# Altium footprint library IntegratedPcbLib.PcbLib: 81 footprints (part 6 of 6)
Each footprint in its own frame and in the unit in brackets; x right, y up, seen from the top. Pads: shape width x height; smd on the part's side, far side on the other; paste and mask are expansions set on the pad; w line width, h text height; cw(c..) or ccw(c..) is an arc to the next point about the centre after c.
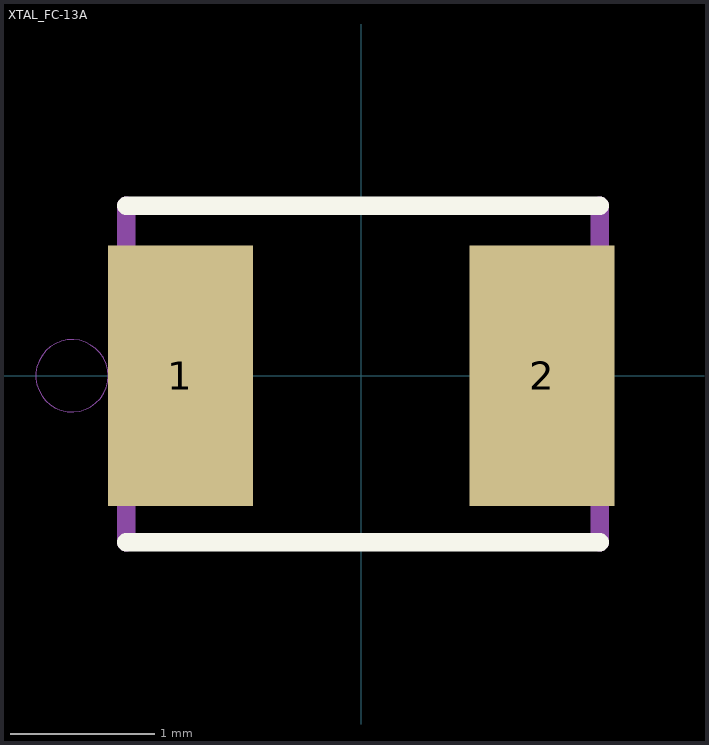
[diagram p5: the footprint, top view; thin cyan lines are the x and y axes]

## XTAL_FC-13A [mm]
pads (2):
  rect 1x1.8 smd: 1(-1.25,0) 2(1.25,0)
Top Overlay:
  lines w0.127: -1.625,-1.15 1.65,-1.15 ; -1.625,1.175 1.65,1.175
Mechanical 4:
  circle w0: c-2,0 r0.25
  circle w0: c-2,0 r0.25
  lines w0.127: -1.625,-1.15 -1.625,1.175 ; 1.65,-1.15 1.65,1.175
3D body "User Library-050008936.step": height 0.8, standoff 0, extent -1.6,-0.7 1.6,0.8